# Altium footprint library UWRT Footprint Library.PcbLib: 258 footprints (part 2 of 17)
Each footprint in its own frame and in the unit in brackets; x right, y up, seen from the top. Pads: shape width x height; smd on the part's side, far side on the other; paste and mask are expansions set on the pad; w line width, h text height; cw(c..) or ccw(c..) is an arc to the next point about the centre after c.
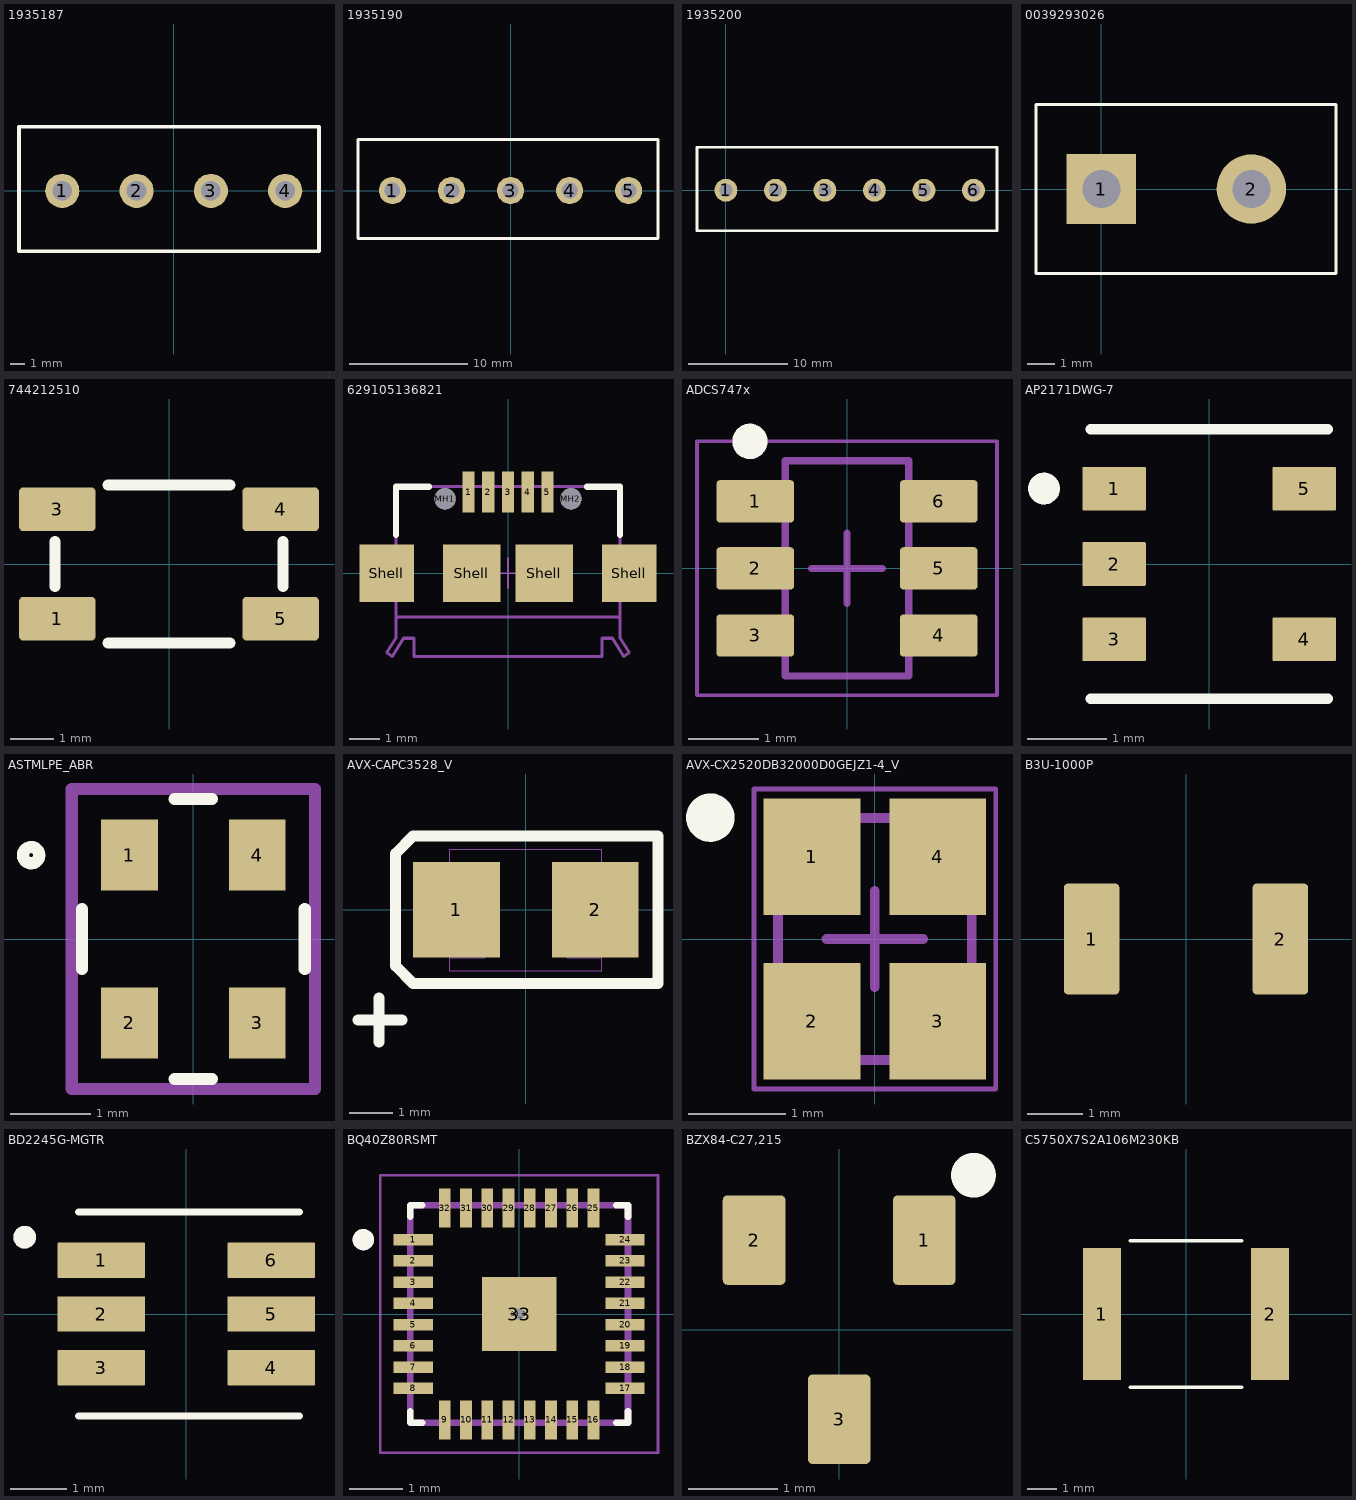
[diagram p1: the footprints below, top view; thin cyan lines are the x and y axes]

## 1935187 [mm]
height 11.4
pads (4):
  round 2.3 hole 1.325: 1(-7.5,0) 2(-2.5,0) 3(2.5,0) 4(7.5,0)
Top Overlay:
  lines w0.254: -10.414,-4.064 9.777,-4.064 9.777,4.318 -10.414,4.318 -10.414,-4.064
3D body "pxc_1935187_04_PT-1-5-4-5-0-H_3D.stp": height 11.41, standoff -3.49, extent -10.793,-4.064 9.777,4.936

## 1935190 [mm]
pads (5):
  round 2.3 hole 1.325: 1(-10,0) 2(-5,0) 3(0,0) 4(5,0) 5(10,0)
Top Overlay:
  lines w0.254: -12.914,-4.064 12.485,-4.064 12.485,4.318 -12.914,4.318 -12.914,-4.064
3D body "1935190.stp": height 11.41, standoff -3.49, extent -13.1,-4.1 12.47,4.9

## 1935200 [mm]
pads (6):
  round 2.3 hole 1.325: 1(0,0) 2(5,0) 3(10,0) 4(15,0) 5(20,0) 6(25,0)
Top Overlay:
  lines w0.254: -2.914,-4.064 -2.914,4.318 27.374,4.318 27.374,-4.064 -2.914,-4.064
3D body "1935200.stp": height 11.41, standoff -3.49, extent -2.706,-4.445 27.864,4.555

## 0039293026 [mm]
pads (2):
  rect 2.55x2.55 hole 1.4: 1(0,0)
  round 2.55 hole 1.4: 2(5.5,0)
Top Overlay:
  lines w0.12: -2.4,-3.1 -2.4,3.1 8.6,3.1 8.6,-3.1 -2.4,-3.1
3D body "039293026.stp": height 12.8, standoff -3.5, extent -2.4,-3.1 8.6,3.1

## 744212510 [mm] "CMC HORIZONTAL 4 J-LEAD"
pads (4):
  rrect20% 1.75x1 smd: 1(-2.55,-1.25) 3(-2.55,1.25) 4(2.55,1.25) 5(2.55,-1.25)
Top Overlay:
  lines w0.254: -2.6,-0.508 -2.6,0.508 ; -1.397,-1.8 1.397,-1.8 ; -1.397,1.8 1.397,1.8 ; 2.6,-0.508 2.6,0.508
3D body "744212100_Download_STP_WE-SL1_rev1.stp": height 1.67, standoff 0.01, extent -2.6,-1.8 2.6,1.8

## 629105136821 [mm] "Micro USB 2.0 SMT Type B Horizontal 5 Contacts"
height 3
pads (11):
  rect 0.4x1.35 smd: 1(-1.3,2.675) 2(-0.65,2.675) 3(0,2.675) 4(0.65,2.675) 5(1.3,2.675)
  round 0.7 hole 0.7 unplated: MH1(-2.075,2.45) MH2(2.075,2.45)
  rect 1.8x1.9 smd: Shell(-4,0) Shell(4,0)
  rect 1.9x1.9 smd: Shell(-1.2,0) Shell(1.2,0)
Top Overlay:
  lines w0.2: -3.7,1.25 -3.7,2.85 -2.6,2.85 ; 2.6,2.85 3.7,2.85 3.7,1.25
Mechanical 2:
  lines w0.1: -3.7,-1.45 3.7,-1.45
  text "PCB Edge" at -1.2,-2.1 h0.41
Mechanical 13:
  lines w0.1: -1.425,2.85 -1.425,3.15 -1.175,3.15 -1.175,2.85 ; -0.775,2.85 -0.775,3.15 -0.525,3.15 -0.525,2.85 ; -0.125,2.85 -0.125,3.15 0.125,3.15 0.125,2.85 ; 0.525,2.85 0.525,3.15 0.775,3.15 0.775,2.85 ; 1.175,2.85 1.175,3.15 1.425,3.15 1.425,2.85 ; -4,-2.625 -3.825,-2.75 -3.45,-2.15 -3.1,-2.15 -3.1,-2.75 3.1,-2.75 3.1,-2.15 3.45,-2.15 3.825,-2.75 4,-2.625 3.7,-2.15 3.7,2.85 -3.7,2.85 -3.7,-2.15 -4,-2.625
Mechanical 15:
  lines w0.05: -0.5,0 0.5,0 ; 0,-0.5 0,0.5
3D body "629105136821.stp": height 2.69, standoff -0.61, extent -4,-2.73 4,3.173

## ADCS747x [mm] "sot-23-6"
pads (6):
  rrect17% 1.1x0.6 smd: 1(-1.3,0.95) 2(-1.3,0) 3(-1.3,-0.95) 4(1.3,-0.95) 5(1.3,0) 6(1.3,0.95)
Top Overlay:
  circle w0.25: c-1.375,1.8 r0.125
Mechanical 13:
  lines w0.1: -0.875,-1.525 0.875,-1.525 0.875,1.525 -0.875,1.525 -0.875,-1.525
Mechanical 15:
  lines w0.05: -2.125,-1.8 2.125,-1.8 2.125,1.8 -2.125,1.8 -2.125,-1.8
  lines w0.1: -0.5,0 0.5,0 ; 0,-0.5 0,0.5
3D body "DDC0006A.stp": height 0.9, standoff -0.02, extent -1.434,-1.485 1.434,1.485

## AP2171DWG-7 [mm]
pads (5):
  rrect5% 0.8x0.55 smd mask+0: 1(-1.2,0.95) 2(-1.2,0) 3(-1.2,-0.95) 4(1.2,-0.95) 5(1.2,0.95)
Top Overlay:
  circle w0.2: c-2.086,0.952 r0.1
  lines w0.127: -1.5,-1.7 1.5,-1.7 ; -1.5,1.7 1.5,1.7
Mechanical 13:
  circle w0.2: c-2.086,0.952 r0.1
3D body "SOT25_DIO.step": height 1.45, standoff 0, extent -1.5,-1.55 1.5,1.55

## ASTMLPE_ABR [mil]
pads (4):
  rect 28x35 smd paste+0: 1(-31.5,41.35) 2(-31.5,-41.35) 3(31.5,-41.35) 4(31.5,41.35)
Top Overlay:
  circle w6: c-80,41.35 r4
  lines w6: -55,-14.83 -55,14.83 ; -9.22,-69 9.22,-69 ; -9.22,69 9.22,69 ; 55,-14.83 55,14.83
Mechanical 15:
  lines w6: -60,-74 -60,-68.85 -60,68.85 -60,74 60,74 60,68.85 60,-68.85 60,-74 -60,-74
3D body "ASTMLPE_ABR.step": height 32.09, standoff 0, extent -45.5,-64.01 45.52,64.02
3D body: height 10, standoff 0, extent 0,0 10,10

## AVX-CAPC3528_V [mm] "SMT Capacitor, 2 Leads, Body 3.5x2.8mm"
pads (2):
  rect 2x2.2 smd: 1(-1.6,0) 2(1.6,0)
Top Overlay:
  lines w0.254: -3.87,-2.54 -2.854,-2.54 ; -3.381,-3.048 -3.381,-2.032 ; -3,-1.3 -2.6,-1.7 3.05,-1.7 3.05,1.7 -2.6,1.7 -3,1.3 -3,-1.3
Mechanical 7:
  lines w0.025: -1.748,-1.404 1.752,-1.404 1.752,1.396 -1.748,1.396 ; -1.748,-1.104 -0.948,-1.104 -0.948,1.096 -1.748,1.096 ; -1.748,-1.404 -1.748,1.396 ; 1.752,-1.104 0.952,-1.104 0.952,1.096 1.752,1.096
  text ".Designator" at -1.8,1.8 h0.5
  text ".Comment" at -1.7,-2.2 h0.5
3D body: height 0.3, standoff 0, extent -1.793,-0.665 -1.568,0.824
3D body: height 0.3, standoff 0, extent 1.578,-0.658 1.803,0.768
3D body: height 1.9, standoff 0, extent -1.704,-1.539 1.763,1.537

## AVX-CX2520DB32000D0GEJZ1-4_V [mm] "Hand Drawn, 4-Leads,Body 2.5x2mm"
height 0.55
pads (4):
  rect 1x1.2 smd: 1(-0.65,0.85) 2(-0.65,-0.85) 3(0.65,-0.85) 4(0.65,0.85)
Top Overlay:
  circle w0.25: c-1.7,1.254 r0.125
Mechanical 13:
  lines w0.1: -1,-1.25 -1,1.25 1,1.25 1,-1.25 -1,-1.25
Mechanical 15:
  lines w0.05: -1.25,-1.55 -1.25,1.55 1.25,1.55 1.25,-1.55 -1.25,-1.55
  lines w0.1: -0.5,0 0.5,0 ; 0,-0.5 0,0.5
3D body: height 0.55, standoff 0, extent -1,-1.25 1,1.25

## B3U-1000P [mm] "TACTILE SWITCH GREY"
pads (2):
  rrect15% 1x2 smd: 1(-1.7,0) 2(1.7,0)
3D body "b3u-1000p.stp": height 1.6, standoff 0, extent -2,-1.25 2,1.25

## BD2245G-MGTR [mm]
pads (6):
  rrect5% 1.55x0.62 smd mask+0: 1(-1.5,0.95) 2(-1.5,0) 3(-1.5,-0.95) 4(1.5,-0.95) 5(1.5,0) 6(1.5,0.95)
Top Overlay:
  circle w0.2: c-2.855,1.357 r0.1
  lines w0.127: -1.9,-1.8 2,-1.8 ; -1.9,1.8 2,1.8
Top Solder:
  drawing of 6 lines, arcs and shapes, not listed
Mechanical 13:
  circle w0.2: c-2.855,1.357 r0.1
3D body "SSOP6_ROM.step": height 1.25, standoff 0, extent -1.499,-1.549 1.499,1.549

## BQ40Z80RSMT [mm] "QFN40P400X400X100-33N_BQ40Z80RSMT(Primary)"
pads (34):
  rect 0.74x0.22 smd: 1(-1.995,1.4) 2(-1.995,1) 3(-1.995,0.6) 4(-1.995,0.2) 5(-1.995,-0.2) 6(-1.995,-0.6) 7(-1.995,-1) 8(-1.995,-1.4) 17(1.995,-1.4) 18(1.995,-1) 19(1.995,-0.6) 20(1.995,-0.2) 21(1.995,0.2) 22(1.995,0.6) 23(1.995,1) 24(1.995,1.4)
  rect 0.22x0.74 smd: 9(-1.4,-1.995) 10(-1,-1.995) 11(-0.6,-1.995) 12(-0.2,-1.995) 13(0.2,-1.995) 14(0.6,-1.995) 15(1,-1.995) 16(1.4,-1.995) 25(1.4,1.995) 26(1,1.995) 27(0.6,1.995) 28(0.2,1.995) 29(-0.2,1.995) 30(-0.6,1.995) 31(-1,1.995) 32(-1.4,1.995)
  rect 1.4x1.4 smd: 33(0,0)
  round 0.4 hole 0.2: 33_1(0,0)
Top Overlay:
  circle w0.2: c-2.935,1.4 r0.1
  lines w0.127: -2.05,-1.83 -2.05,-2.05 -1.83,-2.05 ; -2.05,1.83 -2.05,2.05 -1.83,2.05 ; 1.83,-2.05 2.05,-2.05 2.05,-1.83 ; 1.83,2.05 2.05,2.05 2.05,1.83
Top Paste:
  region: -0.443,0.443 0.443,0.443 0.443,-0.443 -0.443,-0.443
Mechanical 4:
  circle w0.2: c-2.935,1.4 r0.1
  circle w0.2: c-2.935,1.4 r0.1
  lines w0.127: -2.05,-2.05 2.05,-2.05 ; -2.05,-2.05 -2.05,2.05 ; -2.05,-2.05 2.05,-2.05 ; -2.05,-2.05 -2.05,2.05 ; -2.05,2.05 2.05,2.05 ; -2.05,2.05 2.05,2.05 ; 2.05,-2.05 2.05,2.05 ; 2.05,-2.05 2.05,2.05
Mechanical 16:
  lines w0.05: -2.615,-2.615 2.615,-2.615 2.615,2.615 -2.615,2.615 -2.615,-2.615
3D body "RSM0032A.stp": height 1, standoff 0, extent -2,-2 2,2

## BZX84-C27,215 [mm] "DIODE ZENER 27V 250MW TO236AB"
pads (3):
  rrect15% 0.7x1 smd mask+0.1: 1(0.95,1) 2(-0.95,1) 3(0,-1)
Top Overlay:
  circle w0.25: c1.5,1.725 r0.125
3D body "CircuitWorks-SOT-23.step": height 1.11, standoff 0.01, extent -1.5,-1.25 1.5,1.25

## C5750X7S2A106M230KB [mm]
pads (2):
  rect 1.3x4.5 smd mask+0: 1(-2.875,0) 2(2.875,0)
Top Overlay:
  lines w0.127: -1.905,-2.5 1.905,-2.5 ; -1.905,2.5 1.905,2.5
Top Solder:
  region: 3.525,-2.25 2.225,-2.25 2.225,2.25 3.525,2.25
  region: -2.225,-2.25 -3.525,-2.25 -3.525,2.25 -2.225,2.25
3D body "CAP_5750_TDK-L.step": height 1.24, standoff 0, extent -3.048,-2.705 3.048,2.705